# Altium footprint library MYLIB.PcbLib: 600 footprints (part 25 of 39)
Each footprint in its own frame and in the unit in brackets; x right, y up, seen from the top. Pads: shape width x height; smd on the part's side, far side on the other; paste and mask are expansions set on the pad; w line width, h text height; cw(c..) or ccw(c..) is an arc to the next point about the centre after c.
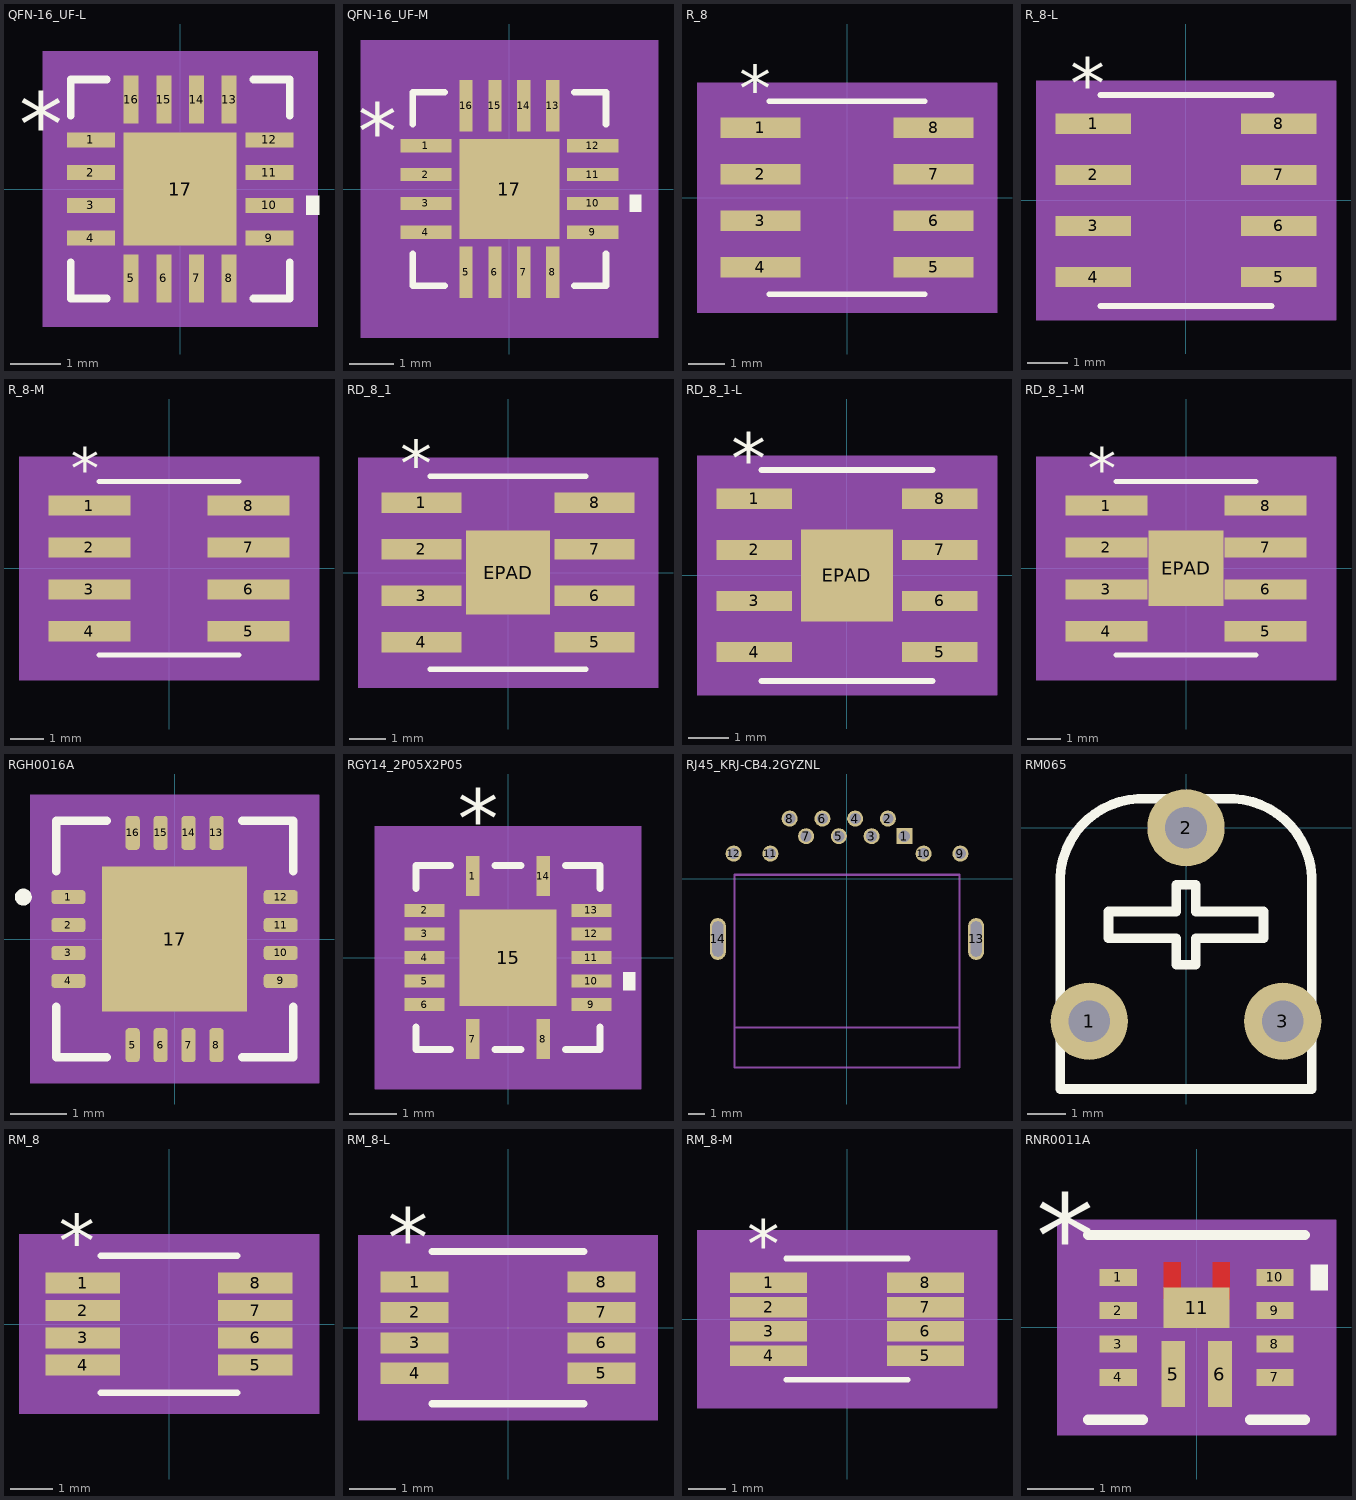
[diagram p24: the footprints below, top view; thin cyan lines are the x and y axes]

## QFN-16_UF-L [mm]
pads (17):
  rect 0.953x0.299 smd paste+0 mask+0: 1(-1.777,0.975) 2(-1.777,0.325) 3(-1.777,-0.325) 4(-1.777,-0.975) 9(1.777,-0.975) 10(1.777,-0.325) 11(1.777,0.325) 12(1.777,0.975)
  rect 0.299x0.953 smd paste+0 mask+0: 5(-0.975,-1.777) 6(-0.325,-1.777) 7(0.325,-1.777) 8(0.975,-1.777) 13(0.975,1.777) 14(0.325,1.777) 15(-0.325,1.777) 16(-0.975,1.777)
  rect 2.25x2.25 smd paste-1.112 mask+0: 17(0,0)
Top Overlay:
  region: 2.507,-0.135 2.761,-0.135 2.761,-0.516 2.507,-0.516
  lines w0.152: -2.177,-1.457 -2.177,-2.177 -1.457,-2.177 ; -2.177,1.457 -2.177,2.177 -1.457,2.177 ; 1.457,-2.177 2.177,-2.177 2.177,-1.457 ; 1.457,2.177 2.177,2.177 2.177,1.457
  text "*" at -3.206,0.665 h1.27
Top Paste:
  region: 1.125,1.125 -1.125,1.125 -1.125,-1.125 1.125,-1.125
Mechanical 5:
  region: 2.736,-2.736 -2.736,-2.736 -2.736,2.736 2.736,2.736
Mechanical 13:
  lines w0.025: -2.05,0.78 -0.78,2.05 ; -2.05,-2.05 -2.05,2.05 2.05,2.05 2.05,-2.05 -2.05,-2.05 ; -2.05,-1.15 -2.05,-0.8 -2.05,-1.15 ; -2.05,-0.5 -2.05,-0.15 -2.05,-0.5 ; -2.05,0.15 -2.05,0.5 -2.05,0.15 ; -2.05,0.8 -2.05,1.15 -2.05,0.8 ; -1.15,-2.05 -0.8,-2.05 -1.15,-2.05 ; -1.15,2.05 -0.8,2.05 -1.15,2.05 ; -0.5,-2.05 -0.15,-2.05 -0.5,-2.05 ; -0.5,2.05 -0.15,2.05 -0.5,2.05 ; 0.15,-2.05 0.5,-2.05 0.15,-2.05 ; 0.15,2.05 0.5,2.05 0.15,2.05 ; 0.8,-2.05 1.15,-2.05 0.8,-2.05 ; 0.8,2.05 1.15,2.05 0.8,2.05 ; 2.05,-1.15 2.05,-0.8 2.05,-1.15 ; 2.05,-0.5 2.05,-0.15 2.05,-0.5 ; 2.05,0.15 2.05,0.5 2.05,0.15 ; 2.05,0.8 2.05,1.15 2.05,0.8
  text "*" at -1.617,0.665 h1.27
Mechanical 15:
  region: -1.226,-2.152 -2.152,-2.152 -2.152,-1.226 -2.355,-1.226 -2.355,1.226 -2.152,1.226 -2.152,2.152 -1.226,2.152 -1.226,2.355 1.226,2.355 1.226,2.152 2.152,2.152 2.152,1.226 2.355,1.226 2.355,-1.226 2.152,-1.226 2.152,-2.152 1.226,-2.152 1.226,-2.355 -1.226,-2.355
  lines w0.152: -2.355,-1.226 -2.355,1.226 -2.152,1.226 -2.152,2.152 -1.226,2.152 -1.226,2.355 1.226,2.355 1.226,2.152 2.152,2.152 2.152,1.226 2.355,1.226 2.355,-1.226 2.152,-1.226 2.152,-2.152 1.226,-2.152 1.226,-2.355 -1.226,-2.355 -1.226,-2.152 -2.152,-2.152 -2.152,-1.226 -2.355,-1.226
3D body: height 0.25, standoff 0, extent 0,0 0.254,0.254

## QFN-16_UF-M [mm]
pads (17):
  rect 1.156x0.299 smd paste+0 mask+0: 1(-1.878,0.975) 2(-1.878,0.325) 3(-1.878,-0.325) 4(-1.878,-0.975) 9(1.878,-0.975) 10(1.878,-0.325) 11(1.878,0.325) 12(1.878,0.975)
  rect 0.299x1.156 smd paste+0 mask+0: 5(-0.975,-1.878) 6(-0.325,-1.878) 7(0.325,-1.878) 8(0.975,-1.878) 13(0.975,1.878) 14(0.325,1.878) 15(-0.325,1.878) 16(-0.975,1.878)
  rect 2.25x2.25 smd paste-1.112 mask+0: 17(0,0)
Top Overlay:
  region: 2.71,-0.135 2.964,-0.135 2.964,-0.516 2.71,-0.516
  lines w0.152: -2.177,-1.457 -2.177,-2.177 -1.457,-2.177 ; -2.177,1.457 -2.177,2.177 -1.457,2.177 ; 1.457,-2.177 2.177,-2.177 2.177,-1.457 ; 1.457,2.177 2.177,2.177 2.177,1.457
  text "*" at -3.409,0.665 h1.27
Top Paste:
  region: 1.125,1.125 -1.125,1.125 -1.125,-1.125 1.125,-1.125
Mechanical 5:
  region: 3.345,-3.345 -3.345,-3.345 -3.345,3.345 3.345,3.345
Mechanical 13:
  lines w0.025: -2.05,0.78 -0.78,2.05 ; -2.05,-2.05 2.05,-2.05 2.05,2.05 -2.05,2.05 -2.05,-2.05 ; -2.05,-1.15 -2.05,-0.8 -2.05,-1.15 ; -2.05,-0.5 -2.05,-0.15 -2.05,-0.5 ; -2.05,0.15 -2.05,0.5 -2.05,0.15 ; -2.05,0.8 -2.05,1.15 -2.05,0.8 ; -1.15,-2.05 -0.8,-2.05 -1.15,-2.05 ; -1.15,2.05 -0.8,2.05 -1.15,2.05 ; -0.5,-2.05 -0.15,-2.05 -0.5,-2.05 ; -0.5,2.05 -0.15,2.05 -0.5,2.05 ; 0.15,-2.05 0.5,-2.05 0.15,-2.05 ; 0.15,2.05 0.5,2.05 0.15,2.05 ; 0.8,-2.05 1.15,-2.05 0.8,-2.05 ; 0.8,2.05 1.15,2.05 0.8,2.05 ; 2.05,-1.15 2.05,-0.8 2.05,-1.15 ; 2.05,-0.5 2.05,-0.15 2.05,-0.5 ; 2.05,0.15 2.05,0.5 2.05,0.15 ; 2.05,0.8 2.05,1.15 2.05,0.8
  text "*" at -1.617,0.665 h1.27
Mechanical 15:
  region: -1.633,-2.558 -2.558,-2.558 -2.558,-1.633 -2.964,-1.633 -2.964,1.633 -2.558,1.633 -2.558,2.558 -1.633,2.558 -1.633,2.964 1.633,2.964 1.633,2.558 2.558,2.558 2.558,1.633 2.964,1.633 2.964,-1.633 2.558,-1.633 2.558,-2.558 1.633,-2.558 1.633,-2.964 -1.633,-2.964
  lines w0.152: -2.964,-1.633 -2.558,-1.633 -2.558,-2.558 -1.633,-2.558 -1.633,-2.964 1.633,-2.964 1.633,-2.558 2.558,-2.558 2.558,-1.633 2.964,-1.633 2.964,1.633 2.558,1.633 2.558,2.558 1.633,2.558 1.633,2.964 -1.633,2.964 -1.633,2.558 -2.558,2.558 -2.558,1.633 -2.964,1.633 -2.964,-1.633
3D body: height 0.25, standoff 0, extent 0,0 0.254,0.254

## R_8 [mil]
pads (8):
  rect 86x22 smd paste+0 mask+0: 1(-93,75) 2(-93,25) 3(-93,-25) 4(-93,-75) 5(93,-75) 6(93,-25) 7(93,25) 8(93,75)
Top Overlay:
  lines w6: -83.5,-103.5 83.5,-103.5 ; -83.5,103.5 83.5,103.5
  text "*" at -115.5,92 h50
Mechanical 5:
  region: 161,-123.5 -161,-123.5 -161,123.5 161,123.5
Mechanical 13:
  lines w0: -12,98.5 ccw(c0,98.5) 12,98.5
  lines w1: -122,-85 -122,-65 -78.5,-65 -78.5,-85 -122,-85 ; -122,-35 -122,-15 -78.5,-15 -78.5,-35 -122,-35 ; -122,15 -122,35 -78.5,35 -78.5,15 -122,15 ; -122,65 -122,85 -78.5,85 -78.5,65 -122,65 ; -78.5,-98.5 78.5,-98.5 78.5,98.5 -78.5,98.5 -78.5,-98.5 ; 78.5,-85 78.5,-65 122,-65 122,-85 78.5,-85 ; 78.5,-35 78.5,-15 122,-15 122,-35 78.5,-35 ; 78.5,15 78.5,35 122,35 122,15 78.5,15 ; 78.5,65 78.5,85 122,85 122,65 78.5,65
  text "*" at -76,45.5 h50
Mechanical 15:
  region: -88.5,-96 -146,-96 -146,96 -88.5,96 -88.5,108.5 88.5,108.5 88.5,96 146,96 146,-96 88.5,-96 88.5,-108.5 -88.5,-108.5
  lines w6: -146,-96 -146,96 -88.5,96 -88.5,108.5 88.5,108.5 88.5,96 146,96 146,-96 88.5,-96 88.5,-108.5 -88.5,-108.5 -88.5,-96 -146,-96
3D body: height 10, standoff 0, extent 0,0 10,10

## R_8-L [mil]
pads (8):
  rect 74x20 smd paste+0 mask+0: 1(-91,75) 2(-91,25) 3(-91,-25) 4(-91,-75) 5(91,-75) 6(91,-25) 7(91,25) 8(91,75)
Top Overlay:
  lines w6: -83.5,-103.5 83.5,-103.5 ; -83.5,103.5 83.5,103.5
  text "*" at -113.5,90 h50
Mechanical 5:
  region: 147,-117.5 -147,-117.5 -147,117.5 147,117.5
Mechanical 13:
  lines w0: -12,98.5 ccw(c0,98.5) 12,98.5
  lines w1: -122,-85 -122,-65 -78.5,-65 -78.5,-85 -122,-85 ; -122,-35 -122,-15 -78.5,-15 -78.5,-35 -122,-35 ; -122,15 -122,35 -78.5,35 -78.5,15 -122,15 ; -122,65 -122,85 -78.5,85 -78.5,65 -122,65 ; -78.5,-98.5 78.5,-98.5 78.5,98.5 -78.5,98.5 -78.5,-98.5 ; 78.5,-85 78.5,-65 122,-65 122,-85 78.5,-85 ; 78.5,-35 78.5,-15 122,-15 122,-35 78.5,-35 ; 78.5,15 78.5,35 122,35 122,15 78.5,15 ; 78.5,65 78.5,85 122,85 122,65 78.5,65
  text "*" at -76,45.5 h50
Mechanical 15:
  region: -82.5,-89 -132,-89 -132,89 -82.5,89 -82.5,102.5 82.5,102.5 82.5,89 132,89 132,-89 82.5,-89 82.5,-102.5 -82.5,-102.5
  lines w6: -132,-89 -132,89 -82.5,89 -82.5,102.5 82.5,102.5 82.5,89 132,89 132,-89 82.5,-89 82.5,-102.5 -82.5,-102.5 -82.5,-89 -132,-89
3D body: height 10, standoff 0, extent 0,0 10,10

## R_8-M [mil]
pads (8):
  rect 98x24 smd paste+0 mask+0: 1(-95,75) 2(-95,25) 3(-95,-25) 4(-95,-75) 5(95,-75) 6(95,-25) 7(95,25) 8(95,75)
Top Overlay:
  lines w6: -83.5,-103.5 83.5,-103.5 ; -83.5,103.5 83.5,103.5
  text "*" at -117.5,94 h50
Mechanical 5:
  region: 179,-133.5 -179,-133.5 -179,133.5 179,133.5
Mechanical 13:
  lines w0: -12,98.5 ccw(c0,98.5) 12,98.5
  lines w1: -122,-85 -122,-65 -78.5,-65 -78.5,-85 -122,-85 ; -122,-35 -122,-15 -78.5,-15 -78.5,-35 -122,-35 ; -122,15 -122,35 -78.5,35 -78.5,15 -122,15 ; -122,65 -122,85 -78.5,85 -78.5,65 -122,65 ; -78.5,-98.5 78.5,-98.5 78.5,98.5 -78.5,98.5 -78.5,-98.5 ; 78.5,-85 78.5,-65 122,-65 122,-85 78.5,-85 ; 78.5,-35 78.5,-15 122,-15 122,-35 78.5,-35 ; 78.5,15 78.5,35 122,35 122,15 78.5,15 ; 78.5,65 78.5,85 122,85 122,65 78.5,65
  text "*" at -76,45.5 h50
Mechanical 15:
  region: -98.5,-107 -164,-107 -164,107 -98.5,107 -98.5,118.5 98.5,118.5 98.5,107 164,107 164,-107 98.5,-107 98.5,-118.5 -98.5,-118.5
  lines w6: -164,-107 -164,107 -98.5,107 -98.5,118.5 98.5,118.5 98.5,107 164,107 164,-107 98.5,-107 98.5,-118.5 -98.5,-118.5 -98.5,-107 -164,-107
3D body: height 10, standoff 0, extent 0,0 10,10

## RD_8_1 [mil]
pads (9):
  rect 86x22 smd paste+0 mask+0: 1(-93,75) 2(-93,25) 3(-93,-25) 4(-93,-75) 5(93,-75) 6(93,-25) 7(93,25) 8(93,75)
  rect 90x90 smd paste-44.5 mask+0: EPAD(0,0)
Top Overlay:
  lines w6: -83.5,-103.5 83.5,-103.5 ; -83.5,103.5 83.5,103.5
  text "*" at -115.5,92 h50
Top Paste:
  region: 45,45 -45,45 -45,-45 45,-45
Mechanical 5:
  region: 161,-123.5 -161,-123.5 -161,123.5 161,123.5
Mechanical 13:
  lines w0: -12,98.5 ccw(c0,98.5) 12,98.5
  lines w1: -122,-85 -78.5,-85 -78.5,-65 -122,-65 -122,-85 ; -122,-35 -78.5,-35 -78.5,-15 -122,-15 -122,-35 ; -122,15 -78.5,15 -78.5,35 -122,35 -122,15 ; -122,65 -78.5,65 -78.5,85 -122,85 -122,65 ; -78.5,-98.5 -78.5,98.5 78.5,98.5 78.5,-98.5 -78.5,-98.5 ; 78.5,-85 122,-85 122,-65 78.5,-65 78.5,-85 ; 78.5,-35 122,-35 122,-15 78.5,-15 78.5,-35 ; 78.5,15 122,15 122,35 78.5,35 78.5,15 ; 78.5,65 122,65 122,85 78.5,85 78.5,65
  text "*" at -76,45.5 h50
Mechanical 15:
  region: -88.5,-96 -146,-96 -146,96 -88.5,96 -88.5,108.5 88.5,108.5 88.5,96 146,96 146,-96 88.5,-96 88.5,-108.5 -88.5,-108.5
  lines w6: -146,-96 -88.5,-96 -88.5,-108.5 88.5,-108.5 88.5,-96 146,-96 146,96 88.5,96 88.5,108.5 -88.5,108.5 -88.5,96 -146,96 -146,-96
3D body: height 10, standoff 0, extent 0,0 10,10

## RD_8_1-L [mil]
pads (9):
  rect 74x20 smd paste+0 mask+0: 1(-91,75) 2(-91,25) 3(-91,-25) 4(-91,-75) 5(91,-75) 6(91,-25) 7(91,25) 8(91,75)
  rect 90x90 smd paste-44.5 mask+0: EPAD(0,0)
Top Overlay:
  lines w6: -83.5,-103.5 83.5,-103.5 ; -83.5,103.5 83.5,103.5
  text "*" at -113.5,90 h50
Top Paste:
  region: 45,45 -45,45 -45,-45 45,-45
Mechanical 5:
  region: 147,-117.5 -147,-117.5 -147,117.5 147,117.5
Mechanical 13:
  lines w0: -12,98.5 ccw(c0,98.5) 12,98.5
  lines w1: -122,-85 -122,-65 -78.5,-65 -78.5,-85 -122,-85 ; -122,-35 -122,-15 -78.5,-15 -78.5,-35 -122,-35 ; -122,15 -122,35 -78.5,35 -78.5,15 -122,15 ; -122,65 -122,85 -78.5,85 -78.5,65 -122,65 ; -78.5,-98.5 78.5,-98.5 78.5,98.5 -78.5,98.5 -78.5,-98.5 ; 78.5,-85 78.5,-65 122,-65 122,-85 78.5,-85 ; 78.5,-35 78.5,-15 122,-15 122,-35 78.5,-35 ; 78.5,15 78.5,35 122,35 122,15 78.5,15 ; 78.5,65 78.5,85 122,85 122,65 78.5,65
  text "*" at -76,45.5 h50
Mechanical 15:
  region: -82.5,-89 -132,-89 -132,89 -82.5,89 -82.5,102.5 82.5,102.5 82.5,89 132,89 132,-89 82.5,-89 82.5,-102.5 -82.5,-102.5
  lines w6: -132,-89 -132,89 -82.5,89 -82.5,102.5 82.5,102.5 82.5,89 132,89 132,-89 82.5,-89 82.5,-102.5 -82.5,-102.5 -82.5,-89 -132,-89
3D body: height 10, standoff 0, extent 0,0 10,10

## RD_8_1-M [mil]
pads (9):
  rect 98x24 smd paste+0 mask+0: 1(-95,75) 2(-95,25) 3(-95,-25) 4(-95,-75) 5(95,-75) 6(95,-25) 7(95,25) 8(95,75)
  rect 90x90 smd paste-44.5 mask+0: EPAD(0,0)
Top Overlay:
  lines w6: -83.5,-103.5 83.5,-103.5 ; -83.5,103.5 83.5,103.5
  text "*" at -117.5,94 h50
Top Paste:
  region: 45,45 -45,45 -45,-45 45,-45
Mechanical 5:
  region: 179,-133.5 -179,-133.5 -179,133.5 179,133.5
Mechanical 13:
  lines w0: -12,98.5 ccw(c0,98.5) 12,98.5
  lines w1: -122,-85 -122,-65 -78.5,-65 -78.5,-85 -122,-85 ; -122,-35 -122,-15 -78.5,-15 -78.5,-35 -122,-35 ; -122,15 -122,35 -78.5,35 -78.5,15 -122,15 ; -122,65 -122,85 -78.5,85 -78.5,65 -122,65 ; -78.5,-98.5 78.5,-98.5 78.5,98.5 -78.5,98.5 -78.5,-98.5 ; 78.5,-85 78.5,-65 122,-65 122,-85 78.5,-85 ; 78.5,-35 78.5,-15 122,-15 122,-35 78.5,-35 ; 78.5,15 78.5,35 122,35 122,15 78.5,15 ; 78.5,65 78.5,85 122,85 122,65 78.5,65
  text "*" at -76,45.5 h50
Mechanical 15:
  region: -98.5,-107 -164,-107 -164,107 -98.5,107 -98.5,118.5 98.5,118.5 98.5,107 164,107 164,-107 98.5,-107 98.5,-118.5 -98.5,-118.5
  lines w6: -164,-107 -164,107 -98.5,107 -98.5,118.5 98.5,118.5 98.5,107 164,107 164,-107 98.5,-107 98.5,-118.5 -98.5,-118.5 -98.5,-107 -164,-107
3D body: height 10, standoff 0, extent 0,0 10,10

## RGH0016A [mil]
pads (17):
  rrect50% 24x10 smd paste+0 mask+2: 1(-74.8,29.53) 2(-74.8,9.84) 3(-74.8,-9.84) 4(-74.8,-29.53) 9(74.8,-29.53) 10(74.8,-9.84) 11(74.8,9.84) 12(74.8,29.53)
  rrect50% 10x24 smd paste+0 mask+2: 5(-29.53,-74.8) 6(-9.84,-74.8) 7(9.84,-74.8) 8(29.53,-74.8) 13(29.53,74.8) 14(9.84,74.8) 15(-9.84,74.8) 16(-29.53,74.8)
  rect 102x102 smd paste-50.5 mask+0: 17(0,0)
Top Overlay:
  circle w6: c-106.65,29.53 r3
  lines w6: -83.5,-47.63 -83.5,-83.5 -47.63,-83.5 ; -83.5,47.63 -83.5,83.5 -47.63,83.5 ; 47.63,-83.5 83.5,-83.5 83.5,-47.63 ; 47.63,83.5 83.5,83.5 83.5,47.63
Top Paste:
  drawing of 16 lines, arcs and shapes, not listed
Top Solder:
  region: 38.87,-53.5 38.87,53.5 53.5,53.5 53.5,-53.5
  region: 23.13,-53.5 23.13,53.5 7.87,53.5 7.87,-53.5
  region: -7.87,-53.5 -7.87,53.5 -23.13,53.5 -23.13,-53.5
  region: -53.5,-53.5 -53.5,53.5 -38.87,53.5 -38.87,-53.5
  region: -53.5,-53.5 -53.5,-38.87 53.5,-38.87 53.5,-53.5
  region: -53.5,-23.13 -53.5,-7.87 53.5,-7.87 53.5,-23.13
  region: -53.5,7.87 -53.5,23.13 53.5,23.13 53.5,7.87
  region: -53.5,38.87 -53.5,53.5 53.5,53.5 53.5,38.87
Mechanical 5:
  region: -101.8,101.8 101.8,101.8 101.8,-101.8 -101.8,-101.8
Mechanical 13:
  circle w0: c-72.8,29.53 r3
  lines w1: -78.5,28.5 -28.5,78.5 ; -78.5,-78.5 -78.5,78.5 78.5,78.5 78.5,-78.5 -78.5,-78.5
Mechanical 15:
  region: -49.53,-88.5 -88.5,-88.5 -88.5,-49.53 -96.8,-49.53 -96.8,49.53 -88.5,49.53 -88.5,88.5 -49.53,88.5 -49.53,96.8 49.53,96.8 49.53,88.5 88.5,88.5 88.5,49.53 96.8,49.53 96.8,-49.53 88.5,-49.53 88.5,-88.5 49.53,-88.5 49.53,-96.8 -49.53,-96.8
  lines w6: -96.8,-49.53 -96.8,49.53 -88.5,49.53 -88.5,88.5 -49.53,88.5 -49.53,96.8 49.53,96.8 49.53,88.5 88.5,88.5 88.5,49.53 96.8,49.53 96.8,-49.53 88.5,-49.53 88.5,-88.5 49.53,-88.5 49.53,-96.8 -49.53,-96.8 -49.53,-88.5 -88.5,-88.5 -88.5,-49.53 -96.8,-49.53
Mechanical 16:
  circle w0: c39.39,0 r4
  circle w0: c0,39.39 r4
  circle w0: c0,0 r4
  circle w0: c0,-39.39 r4
  circle w0: c-39.39,0 r4
3D body: height 10, standoff 0, extent 0,0 10,10

## RGY14_2P05X2P05 [mm]
pads (15):
  rect 0.28x0.85 smd paste-0.412 mask+0: 1(-0.75,1.731) 7(-0.75,-1.731) 8(0.75,-1.731) 14(0.75,1.731)
  rect 0.85x0.28 smd paste-0.412 mask+0: 2(-1.769,1) 3(-1.769,0.5) 4(-1.769,0) 5(-1.769,-0.5) 6(-1.769,-1) 9(1.769,-1) 10(1.769,-0.5) 11(1.769,0) 12(1.769,0.5) 13(1.769,1)
  rect 2.05x2.05 smd paste-1.012 mask-1.016: 15(0,0)
Top Overlay:
  region: 2.448,-0.309 2.702,-0.309 2.702,-0.69 2.448,-0.69
  lines w0.152: -1.952,-1.473 -1.952,-1.952 -1.223,-1.952 ; -1.952,1.473 -1.952,1.952 -1.223,1.952 ; -0.277,-1.952 0.277,-1.952 ; -0.277,1.952 0.277,1.952 ; 1.223,-1.952 1.952,-1.952 1.952,-1.473 ; 1.223,1.952 1.952,1.952 1.952,1.473
  text "*" at -1.068,2.308 h1.27
Top Paste:
  drawing of 27 lines, arcs and shapes, not listed
Top Solder:
  region: -1.274,1.21 -2.264,1.21 -2.264,0.79 -1.274,0.79
  region: -1.274,0.71 -2.264,0.71 -2.264,0.29 -1.274,0.29
  region: -1.274,0.21 -2.264,0.21 -2.264,-0.21 -1.274,-0.21
  region: -1.274,-0.29 -2.264,-0.29 -2.264,-0.71 -1.274,-0.71
  region: -1.274,-0.79 -2.264,-0.79 -2.264,-1.21 -1.274,-1.21
  region: -0.54,-1.236 -0.96,-1.236 -0.96,-2.226 -0.54,-2.226
  region: 0.96,-1.236 0.54,-1.236 0.54,-2.226 0.96,-2.226
  region: 2.264,-0.79 1.274,-0.79 1.274,-1.21 2.264,-1.21
  region: 2.264,-0.29 1.274,-0.29 1.274,-0.71 2.264,-0.71
  region: 2.264,0.21 1.274,0.21 1.274,-0.21 2.264,-0.21
  region: 2.264,0.71 1.274,0.71 1.274,0.29 2.264,0.29
  region: 2.264,1.21 1.274,1.21 1.274,0.79 2.264,0.79
  region: 0.96,2.226 0.54,2.226 0.54,1.236 0.96,1.236
  region: -0.54,2.226 -0.96,2.226 -0.96,1.236 -0.54,1.236
  region: 0,1.025
  region: 0,1.025
  region: 0,-1.025
  region: 0,-1.025
  region: -1.088,0.594 -1.088,1.088 1.088,1.088 1.088,0.594
  region: -1.088,-0.194 -1.088,0.194 1.088,0.194 1.088,-0.194
  region: -1.088,-1.088 -1.088,-0.594 1.088,-0.594 1.088,-1.088
  region: -1.088,-1.088 -1.088,1.088 -0.594,1.088 -0.594,-1.088
  region: 0.194,-1.088 0.194,1.088 -0.194,1.088 -0.194,-1.088
  region: 0.594,-1.088 0.594,1.088 1.088,1.088 1.088,-1.088
Mechanical 5:
  region: 2.829,-2.791 -2.829,-2.791 -2.829,2.791 2.829,2.791
Mechanical 13:
  lines w0.025: -1.825,0.555 -0.555,1.825 ; -1.825,-1.825 1.825,-1.825 1.825,1.825 -1.825,1.825 -1.825,-1.825
  text "*" at -1.068,0.671 h1.27
Mechanical 15:
  region: 2.448,-2.41 -2.448,-2.41 -2.448,2.41 2.448,2.41
  lines w0.152: -2.448,-2.41 -2.448,2.41 2.448,2.41 2.448,-2.41 -2.448,-2.41
Mechanical 16:
  circle w0.127: c-0.394,-0.394 r0.191
  circle w0.127: c-0.394,0.394 r0.191
  circle w0.127: c0.394,-0.394 r0.191
  circle w0.127: c0.394,0.394 r0.191
3D body: height 0.25, standoff 0, extent 0,0 0.254,0.254

## RJ45_KRJ-CB4.2GYZNL [mm] "RJ45  connector, right angle"
height 1
pads (14):
  rect 1x1 hole 0.7: 1(3.57,2.65)
  round 1 hole 0.7: 2(2.55,3.75) 3(1.53,2.65) 4(0.51,3.75) 5(-0.51,2.65) 6(-1.53,3.75) 7(-2.55,2.65) 8(-3.57,3.75) 9(7.06,1.57) 10(4.77,1.57) 11(-4.77,1.57) 12(-7.06,1.57)
  oval 1x2.6 hole 0.7 slot 2.2 at 90 deg: 13(8.04,-3.75) 14(-8.04,-3.75)
Mechanical 1:
  lines w0.127: -7,-9.25 7,-9.25 ; -7,-11.75 -7,0.25 7,0.25 7,-11.75 -7,-11.75
3D body: height 4.2, standoff -4.2, extent -7,-9.25 7,0.25
3D body: height 6.8, standoff 0, extent -8.103,-9.25 8.077,3.465
3D body: height 6.8, standoff -4.2, extent -8.103,-11.75 8.077,-9.25

## RM065 [mil] "蓝白可调电位器"
pads (3):
  round 80 hole 43.31: 1(-100,-200) 2(0,0) 3(100,-200)
Top Overlay:
  lines w10: -130,-270 130,-270 130,-50 ccw(c45,-55) 40,30 -40,30 ccw(c-45,-55) -130,-50 -130,-270 ; -80,-114.17 -80,-86.61 -10,-86.61 -10,-70 -10,-59.06 10,-59.06 10,-86.61 80,-86.61 80,-114.17 10,-114.17 10,-141.73 -10,-141.73 -10,-114.17 -80,-114.17
3D body "RM065.STEP": height 299.21, standoff -137.8, extent -127.95,-268.83 127.96,29.59

## RM_8 [mm]
pads (8):
  rect 1.761x0.501 smd paste+0 mask+0: 1(-2.05,0.975) 2(-2.05,0.325) 3(-2.05,-0.325) 4(-2.05,-0.975) 5(2.05,-0.975) 6(2.05,-0.325) 7(2.05,0.325) 8(2.05,0.975)
Top Overlay:
  lines w0.152: -1.627,-1.627 1.627,-1.627 ; -1.627,1.627 1.627,1.627
  text "*" at -2.621,1.349 h1.27
Mechanical 5:
  region: 3.566,-2.135 -3.566,-2.135 -3.566,2.135 3.566,2.135
Mechanical 13:
  lines w0: -0.305,1.5 ccw(c0,1.5) 0.305,1.5
  lines w0.025: -2.575,-1.2 -1.5,-1.2 -1.5,-0.75 -2.575,-0.75 -2.575,-1.2 ; -2.575,-0.55 -1.5,-0.55 -1.5,-0.1 -2.575,-0.1 -2.575,-0.55 ; -2.575,0.1 -1.5,0.1 -1.5,0.55 -2.575,0.55 -2.575,0.1 ; -2.575,0.75 -1.5,0.75 -1.5,1.2 -2.575,1.2 -2.575,0.75 ; -1.5,-1.5 -1.5,1.5 1.5,1.5 1.5,-1.5 -1.5,-1.5 ; 1.5,-1.2 2.575,-1.2 2.575,-0.75 1.5,-0.75 1.5,-1.2 ; 1.5,-0.55 2.575,-0.55 2.575,-0.1 1.5,-0.1 1.5,-0.55 ; 1.5,0.1 2.575,0.1 2.575,0.55 1.5,0.55 1.5,0.1 ; 1.5,0.75 2.575,0.75 2.575,1.2 1.5,1.2 1.5,0.75
  text "*" at -1.436,0.154 h1.27
Mechanical 15:
  region: -1.754,-1.479 -3.185,-1.479 -3.185,1.479 -1.754,1.479 -1.754,1.754 1.754,1.754 1.754,1.479 3.185,1.479 3.185,-1.479 1.754,-1.479 1.754,-1.754 -1.754,-1.754
  lines w0.152: -3.185,-1.479 -1.754,-1.479 -1.754,-1.754 1.754,-1.754 1.754,-1.479 3.185,-1.479 3.185,1.479 1.754,1.479 1.754,1.754 -1.754,1.754 -1.754,1.479 -3.185,1.479 -3.185,-1.479
3D body: height 0.25, standoff 0, extent 0,0 0.254,0.254

## RM_8-L [mm]
pads (8):
  rect 1.456x0.45 smd paste+0 mask+0: 1(-1.999,0.975) 2(-1.999,0.325) 3(-1.999,-0.325) 4(-1.999,-0.975) 5(1.999,-0.975) 6(1.999,-0.325) 7(1.999,0.325) 8(1.999,0.975)
Top Overlay:
  lines w0.152: -1.627,-1.627 1.627,-1.627 ; -1.627,1.627 1.627,1.627
  text "*" at -2.571,1.298 h1.27
Mechanical 5:
  region: 3.21,-1.983 -3.21,-1.983 -3.21,1.983 3.21,1.983
Mechanical 13:
  lines w0: -0.305,1.5 ccw(c0,1.5) 0.305,1.5
  lines w0.025: -2.575,-1.2 -1.5,-1.2 -1.5,-0.75 -2.575,-0.75 -2.575,-1.2 ; -2.575,-0.55 -1.5,-0.55 -1.5,-0.1 -2.575,-0.1 -2.575,-0.55 ; -2.575,0.1 -1.5,0.1 -1.5,0.55 -2.575,0.55 -2.575,0.1 ; -2.575,0.75 -1.5,0.75 -1.5,1.2 -2.575,1.2 -2.575,0.75 ; -1.5,-1.5 -1.5,1.5 1.5,1.5 1.5,-1.5 -1.5,-1.5 ; 1.5,-1.2 2.575,-1.2 2.575,-0.75 1.5,-0.75 1.5,-1.2 ; 1.5,-0.55 2.575,-0.55 2.575,-0.1 1.5,-0.1 1.5,-0.55 ; 1.5,0.1 2.575,0.1 2.575,0.55 1.5,0.55 1.5,0.1 ; 1.5,0.75 2.575,0.75 2.575,1.2 1.5,1.2 1.5,0.75
  text "*" at -1.436,0.154 h1.27
Mechanical 15:
  region: -1.602,-1.302 -2.829,-1.302 -2.829,1.302 -1.602,1.302 -1.602,1.602 1.602,1.602 1.602,1.302 2.829,1.302 2.829,-1.302 1.602,-1.302 1.602,-1.602 -1.602,-1.602
  lines w0.152: -2.829,-1.302 -1.602,-1.302 -1.602,-1.602 1.602,-1.602 1.602,-1.302 2.829,-1.302 2.829,1.302 1.602,1.302 1.602,1.602 -1.602,1.602 -1.602,1.302 -2.829,1.302 -2.829,-1.302
3D body: height 0.25, standoff 0, extent 0,0 0.254,0.254

## RM_8-M [mm]
pads (8):
  rect 2.066x0.552 smd paste+0 mask+0: 1(-2.101,0.975) 2(-2.101,0.325) 3(-2.101,-0.325) 4(-2.101,-0.975) 5(2.101,-0.975) 6(2.101,-0.325) 7(2.101,0.325) 8(2.101,0.975)
Top Overlay:
  lines w0.152: -1.627,-1.627 1.627,-1.627 ; -1.627,1.627 1.627,1.627
  text "*" at -2.672,1.4 h1.27
Mechanical 5:
  region: 4.023,-2.389 -4.023,-2.389 -4.023,2.389 4.023,2.389
Mechanical 13:
  lines w0: -0.305,1.5 ccw(c0,1.5) 0.305,1.5
  lines w0.025: -2.575,-1.2 -2.575,-0.75 -1.5,-0.75 -1.5,-1.2 -2.575,-1.2 ; -2.575,-0.55 -2.575,-0.1 -1.5,-0.1 -1.5,-0.55 -2.575,-0.55 ; -2.575,0.1 -2.575,0.55 -1.5,0.55 -1.5,0.1 -2.575,0.1 ; -2.575,0.75 -2.575,1.2 -1.5,1.2 -1.5,0.75 -2.575,0.75 ; -1.5,-1.5 1.5,-1.5 1.5,1.5 -1.5,1.5 -1.5,-1.5 ; 1.5,-1.2 1.5,-0.75 2.575,-0.75 2.575,-1.2 1.5,-1.2 ; 1.5,-0.55 1.5,-0.1 2.575,-0.1 2.575,-0.55 1.5,-0.55 ; 1.5,0.1 1.5,0.55 2.575,0.55 2.575,0.1 1.5,0.1 ; 1.5,0.75 1.5,1.2 2.575,1.2 2.575,0.75 1.5,0.75
  text "*" at -1.436,0.154 h1.27
Mechanical 15:
  region: -2.008,-1.759 -3.642,-1.759 -3.642,1.759 -2.008,1.759 -2.008,2.008 2.008,2.008 2.008,1.759 3.642,1.759 3.642,-1.759 2.008,-1.759 2.008,-2.008 -2.008,-2.008
  lines w0.152: -3.642,-1.759 -3.642,1.759 -2.008,1.759 -2.008,2.008 2.008,2.008 2.008,1.759 3.642,1.759 3.642,-1.759 2.008,-1.759 2.008,-2.008 -2.008,-2.008 -2.008,-1.759 -3.642,-1.759
3D body: height 0.25, standoff 0, extent 0,0 0.254,0.254

## RNR0011A [mil]
pads (11):
  rect 22x10 smd paste-5 mask+2: 1(-46.26,29.53) 2(-46.26,9.84) 3(-46.26,-9.84) 4(-46.26,-29.53) 7(46.26,-29.53) 8(46.26,-9.84) 9(46.26,9.84) 10(46.26,29.53)
  rect 14x39 smd paste+0 mask+2: 5(-13.78,-27.56) 6(13.78,-27.56)
  rect 39x24 smd paste-12 mask+2: 11(0,11.61)
Top Layer:
  region: 9.49,16.56 9.49,38.56 19.49,38.56 19.49,16.56
  region: -9.49,16.56 -9.49,38.56 -19.49,38.56 -19.49,16.56
Top Overlay:
  region: 67.26,37.03 77.26,37.03 77.26,22.03 67.26,22.03
  lines w6: -64,-54.5 -31.56,-54.5 ; -64,54.5 64,54.5 ; 31.56,-54.5 64,-54.5
  text "*" at -94.76,29.37 h50
Top Paste:
  region: -9.49,16.56 -9.49,38.56 -19.49,38.56 -19.49,16.56
  region: 9.49,16.56 9.49,38.56 19.49,38.56 19.49,16.56
  region: 19.5,12 -19.5,12 -19.5,-12 19.5,-12
  region: -8.78,38.56 -18.78,38.56 -18.78,16.56 -8.78,16.56
  region: 18.78,38.56 8.78,38.56 8.78,16.56 18.78,16.56
  region: 57.26,34.53 35.26,34.53 35.26,24.53 57.26,24.53
  region: 57.26,14.84 35.26,14.84 35.26,4.84 57.26,4.84
  region: 57.26,-4.84 35.26,-4.84 35.26,-14.84 57.26,-14.84
  region: 57.26,-24.53 35.26,-24.53 35.26,-34.53 57.26,-34.53
  region: 18.78,-16.56 8.78,-16.56 8.78,-38.56 18.78,-38.56
  region: -8.78,-16.56 -18.78,-16.56 -18.78,-38.56 -8.78,-38.56
  region: -35.26,-24.53 -57.26,-24.53 -57.26,-34.53 -35.26,-34.53
  region: -35.26,-4.84 -57.26,-4.84 -57.26,-14.84 -35.26,-14.84
  region: -35.26,14.84 -57.26,14.84 -57.26,4.84 -35.26,4.84
  region: -35.26,34.53 -57.26,34.53 -57.26,24.53 -35.26,24.53
Top Solder:
  region: -8.78,38.56 -18.78,38.56 -18.78,16.56 -8.78,16.56
  region: 18.78,38.56 8.78,38.56 8.78,16.56 18.78,16.56
  region: 57.26,34.53 35.26,34.53 35.26,24.53 57.26,24.53
  region: 57.26,14.84 35.26,14.84 35.26,4.84 57.26,4.84
  region: 57.26,-4.84 35.26,-4.84 35.26,-14.84 57.26,-14.84
  region: 57.26,-24.53 35.26,-24.53 35.26,-34.53 57.26,-34.53
  region: 18.78,-16.56 8.78,-16.56 8.78,-38.56 18.78,-38.56
  region: -8.78,-16.56 -18.78,-16.56 -18.78,-38.56 -8.78,-38.56
  region: -35.26,-24.53 -57.26,-24.53 -57.26,-34.53 -35.26,-34.53
  region: -35.26,-4.84 -57.26,-4.84 -57.26,-14.84 -35.26,-14.84
  region: -35.26,14.84 -57.26,14.84 -57.26,4.84 -35.26,4.84
  region: -35.26,34.53 -57.26,34.53 -57.26,24.53 -35.26,24.53
  region: -9.49,16.56 -9.49,38.56 -19.49,38.56 -19.49,16.56
  region: 9.49,16.56 9.49,38.56 19.49,38.56 19.49,16.56
Mechanical 5:
  region: 82.26,-63.56 -82.26,-63.56 -82.26,63.56 82.26,63.56
Mechanical 13:
  lines w1: -49,-10.5 1,39.5 ; -49,-39.5 -49,39.5 49,39.5 49,-39.5 -49,-39.5
  text "*" at -37.76,14.37 h50
Mechanical 15:
  region: -28.78,-49.5 -59,-49.5 -59,-44.53 -67.26,-44.53 -67.26,44.53 -59,44.53 -59,49.5 -28.78,49.5 28.78,49.5 59,49.5 59,44.53 67.26,44.53 67.26,-44.53 59,-44.53 59,-49.5 28.78,-49.5
  lines w6: -67.26,-44.53 -67.26,44.53 -59,44.53 -59,49.5 -28.78,49.5 28.78,49.5 59,49.5 59,44.53 67.26,44.53 67.26,-44.53 59,-44.53 59,-49.5 28.78,-49.5 -28.78,-49.5 -59,-49.5 -59,-44.53 -67.26,-44.53
Mechanical 16:
  circle w0.5: c0,39.37 r4.25
3D body: height 10, standoff 0, extent 0,0 10,10